# Altium integrated library connectors_ITS.IntLib: 29 symbols
Pins are listed as number, name and electrical type; pins without a type are passive.

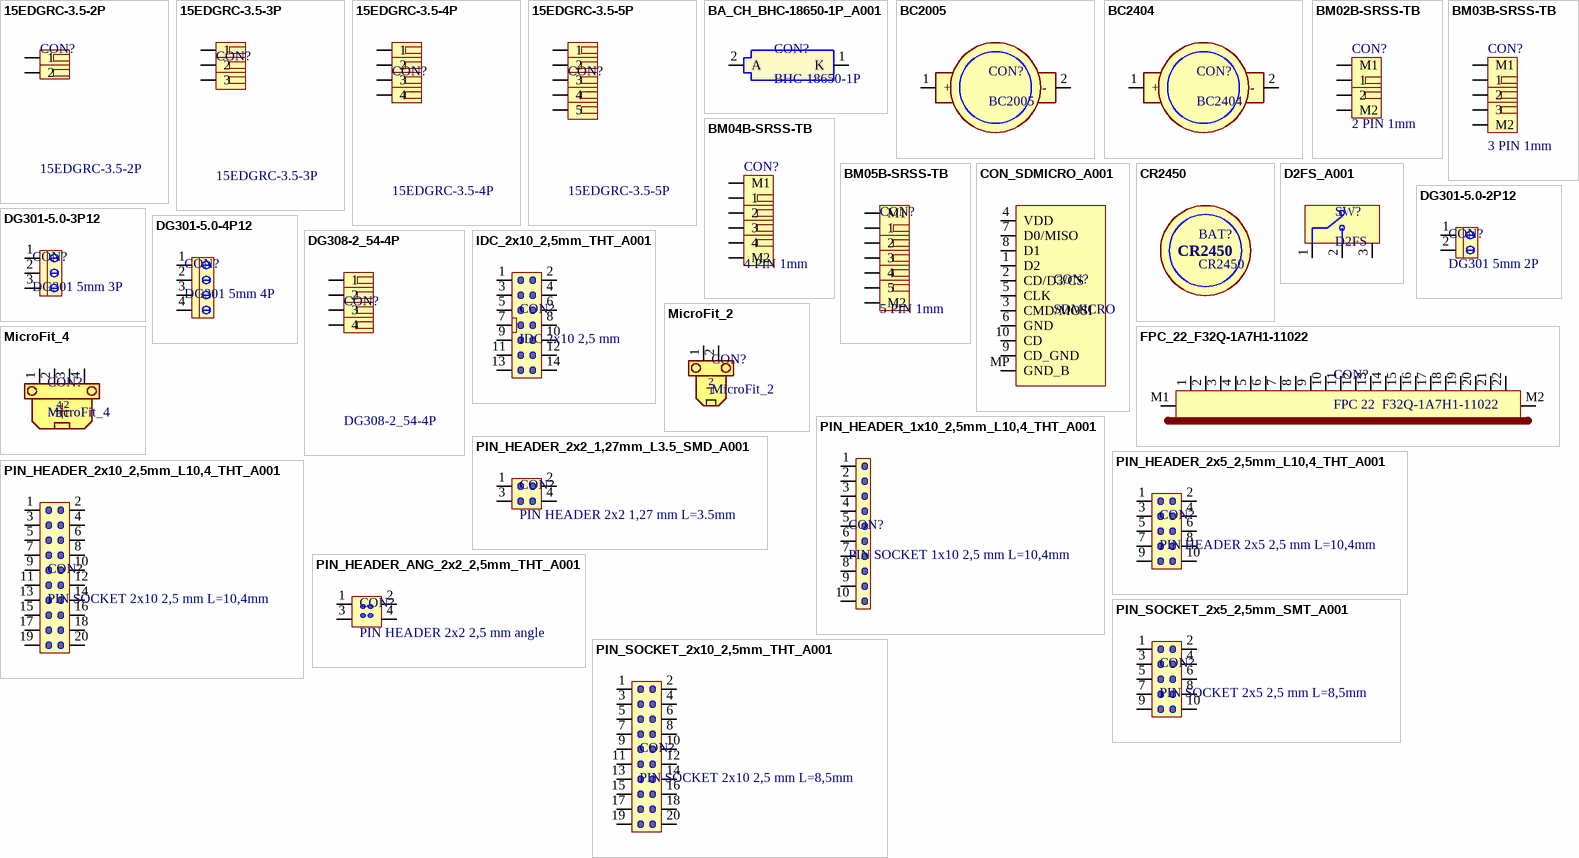
[diagram p0: symbols 15EDGRC-3.5-2P to PIN_SOCKET_2x10_2,5mm_THT_A001]

## 15EDGRC-3.5-2P
designator CON?
footprint 15EDGRC-3.5-02P (Dexon)
pins: 1, 2

## 15EDGRC-3.5-3P
designator CON?
footprint 15EDGRC-3.5-03P (Dexon)
pins: 1, 2, 3

## 15EDGRC-3.5-4P
designator CON?
footprint 15EDGRC-3.5-04P (Dexon)
pins: 1, 2, 3, 4

## 15EDGRC-3.5-5P
designator CON?
footprint 15EDGRC-3.5-05P (Dexon)
pins: 1, 2, 3, 4, 5

## BA_CH_BHC-18650-1P_A001
designator CON?, comment BHC-18650-1P
battery holder 18650 1S; ITSN: BA_CH_BHC-18650-1P_THT_A001
footprint BHC-18650-1P (COMF baterry holder 18650 THT 1p)
pins: 1 K, 2 A

## BC2005
designator CON?
smd cr2450 BATTERY HOLDER; ITSN: CON_SMT_CR2450_A001
footprint BC2005 (CR2450)
pins: 1 + (power), 2 - (power)

## BC2404
designator CON?
smd cr2450 BATTERY HOLDER; ITSN: CON_SMT_CR2450_A001
footprint BC2404 (CR2450)
pins: 1 + (power), 2 - (power)

## BM02B-SRSS-TB
designator CON?, comment 2 PIN 1mm
BM02B-SRSS-TB 1MM 2PIN; ITSN: CON_SMT_2PIN_1MM_A001
footprint BM02B-SRSS-TB (JST SH connector 1mm)
pins: 1, 2, M1, M2

## BM03B-SRSS-TB
designator CON?, comment 3 PIN 1mm
BM03B-SRSS-TB 1MM 3PIN; ITSN: CON_SMT_3PIN_1MM_A001
footprint BM03B-SRSS-TB (JST SH connector 1mm)
pins: 1, 2, 3, M1, M2

## BM04B-SRSS-TB
designator CON?, comment 4 PIN 1mm
BM04B-SRSS-TB 1MM 3PIN; ITSN: CON_SMT_3PIN_1MM_A001
footprint BM04B-SRSS-TB (JST SH connector 1mm)
pins: 1, 2, 3, 4, M1, M2

## BM05B-SRSS-TB
designator CON?, comment 5 PIN 1mm
BM05B-SRSS-TB 1MM 5PIN; ITSN: CON_SMT_5PIN_1MM_A001
footprint BM05B-SRSS-TB (JST SH connector 1mm)
pins: 1, 2, 3, 4, 5, M1, M2

## CON_SDMICRO_A001
designator CON?, comment SDMICRO
MOLEX : 502570-0893; ITSN: CON_MICRO_SD_SMD_A001
footprint SD_micro_MOLEX_5025700893 (MOLEX : 502570-0893)
pins: 1 D2, 2 CD/D3/CS, 3 CMD/MOSI, 4 VDD, 5 CLK, 6 GND, 7 D0/MISO, 8 D1, 9 CD_GND, 10 CD, MP GND_B

## CR2450
designator BAT?
3V 600mAh Lith.; ITSN: BAT_CR2450_A001
footprint CR2450 (battery CR2450)

## D2FS_A001
designator SW?, comment D2FS
Omron D2FS-FL-N; ITSN: *
footprint D2FS-FL-N_A001 (omron D2FS-FL-Nxx)
pins: 1 COM, 2 NO, 3 NC

## DG301-5.0-2P12
designator CON?, comment DG301 5mm 2P
ITSN: CON_DG301_5.0_2P_A001
footprint DG301-5_0-2P12
pins: 1, 2

## DG301-5.0-3P12
designator CON?, comment DG301 5mm 3P
ITSN: CON_DG301_5.0_3P_A001
footprint DG301-5_0-3P12
pins: 1, 2, 3

## DG301-5.0-4P12
designator CON?, comment DG301 5mm 4P
ITSN: CON_DG301_5.0_4P_A001
footprint DG301-5_0-4P12
pins: 1, 2, 3, 4

## DG308-2_54-4P
designator CON?
zlacze srubowe 4x 2,54mm
footprint DG308-2_54-4P
pins: 1, 2, 3, 4

## FPC_22_F32Q-1A7H1-11022
designator CON?, comment FPC 22  F32Q-1A7H1-11022
F32Q-1A7H1-11022; ITSN: CON_FPC22_05_TOP_A001
footprint F32Q-1A7H1-11022 (FPC top 22pin e - 0,5mm)
pins: 1, 2, 3, 4, 5, 6, 7, 8, 9, 10, 11, 12, 13, 14, 15, 16, 17, 18, 19, 20, 21, 22, M1, M2

## IDC_2x10_2,5mm_THT_A001
designator CON?, comment IDC 2x10 2,5 mm
footprint IDC_2.54mm_2x7_THT
pins: 1, 2, 3, 4, 5, 6, 7, 8, 9, 10, 11, 12, 13, 14

## MicroFit_2
designator CON?
footprint G-MicroFit-2_GK (Gniazdo kontowe MicroiFit 2 piny)
pins: 1, 2

## MicroFit_4
designator CON?
footprint G-MicroFit-4_GK (Gniazdo kontowe MiniFit 4 piny)
pins: 1, 2, 3, 4

## PIN_HEADER_1x10_2,5mm_L10,4_THT_A001
designator CON?, comment PIN SOCKET 1x10 2,5 mm L=10,4mm
footprint PIN_HEADER_1x10_2,5mm_L10,4_THT_A001
pins: 1, 2, 3, 4, 5, 6, 7, 8, 9, 10

## PIN_HEADER_2x2_1,27mm_L3.5_SMD_A001
designator CON?, comment PIN HEADER 2x2 1,27 mm L=3.5mm
footprint PIN_HEADER_2x2_1,27mm_L3.5_SMT_A001
pins: 1, 2, 3, 4

## PIN_HEADER_2x5_2,5mm_L10,4_THT_A001
designator CON?, comment PIN HEADER 2x5 2,5 mm L=10,4mm
footprint PIN_HEADER_2x5_2,5mm_L10,4_THT_A001
pins: 1, 2, 3, 4, 5, 6, 7, 8, 9, 10

## PIN_HEADER_2x10_2,5mm_L10,4_THT_A001
designator CON?, comment PIN SOCKET 2x10 2,5 mm L=10,4mm
footprint PIN_HEADER_2x10_2,5mm_L10,4_THT_A001
pins: 1, 2, 3, 4, 5, 6, 7, 8, 9, 10, 11, 12, 13, 14, 15, 16, 17, 18, 19, 20

## PIN_HEADER_ANG_2x2_2,5mm_THT_A001
designator CON?, comment PIN HEADER 2x2 2,5 mm angle
footprint PIN_HEADER_ANG_2x2_2,5mm_THT_A001
pins: 1, 2, 3, 4

## PIN_SOCKET_2x5_2,5mm_SMT_A001
designator CON?, comment PIN SOCKET 2x5 2,5 mm L=8,5mm
footprint PIN_SOCKET_2x5_2,5mm_L8,5_THT_A001
pins: 1, 2, 3, 4, 5, 6, 7, 8, 9, 10

## PIN_SOCKET_2x10_2,5mm_THT_A001
designator CON?, comment PIN SOCKET 2x10 2,5 mm L=8,5mm
footprint PIN_SOCKET_2x10_2,5mm_L8,5_THT_A001
pins: 1, 2, 3, 4, 5, 6, 7, 8, 9, 10, 11, 12, 13, 14, 15, 16, 17, 18, 19, 20